# Altium footprint library 3.22-杂项.PcbLib: 985 footprints (part 8 of 64)
Each footprint in its own frame and in the unit in brackets; x right, y up, seen from the top. Pads: shape width x height; smd on the part's side, far side on the other; paste and mask are expansions set on the pad; w line width, h text height; cw(c..) or ccw(c..) is an arc to the next point about the centre after c.
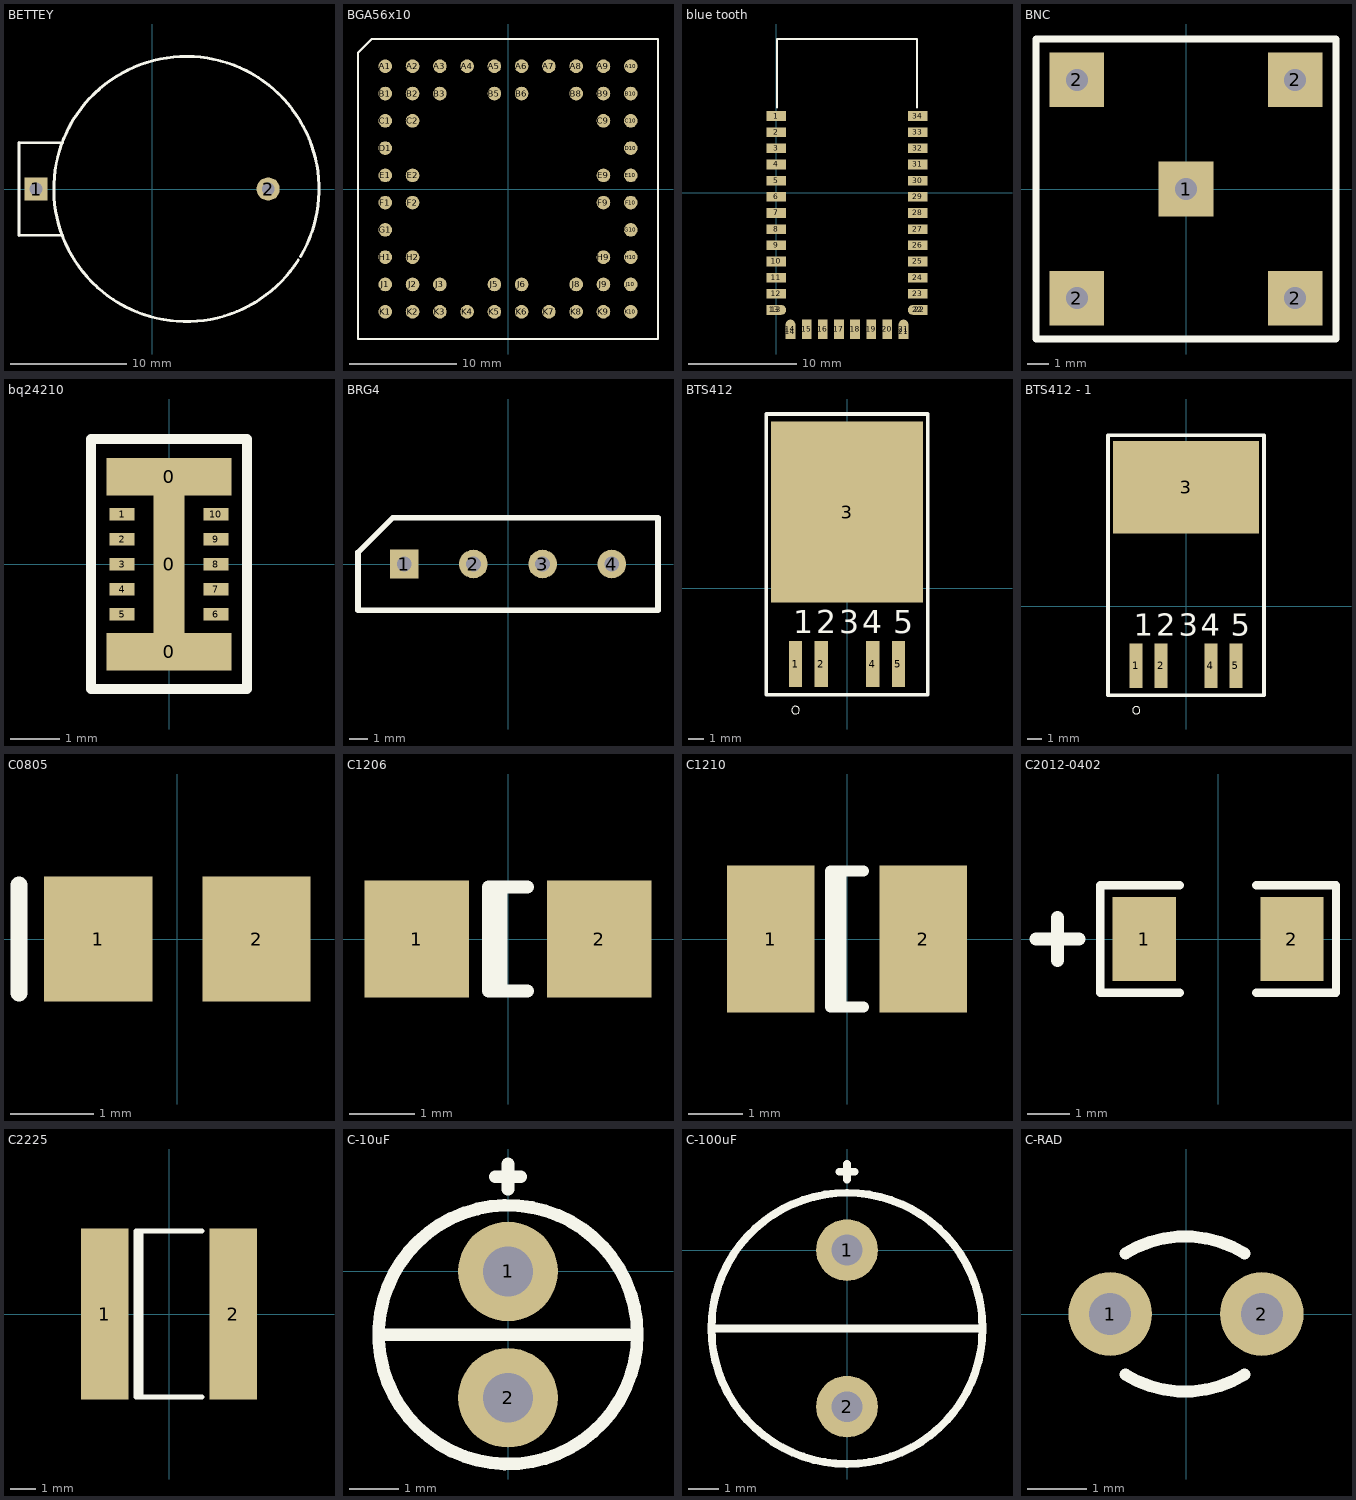
[diagram p7: the footprints below, top view; thin cyan lines are the x and y axes]

## BETTEY [mm] "3V钮扣电池，2脚"
pads (2):
  rect 2x2 hole 1.1: 1(-10,0)
  round 2 hole 1.1: 2(10,0)
Top Overlay:
  lines w0.2: -11.476,-4 -7.714,-4 ; -11.476,4 -7.714,4
  lines w0.254: -11.476,-4 -11.476,4 ; 12.597,-6.136 cw(c2.954,0) 12.787,-5.827

## BGA56x10 [mil]
pads (56):
  round 50 smd: A1(-450,450) A2(-350,450) A3(-250,450) A4(-150,450) A5(-50,450) A6(50,450) A7(150,450) A8(250,450) A9(350,450) A10(450,450) B1(-450,350) B2(-350,350) B3(-250,350) B5(-50,350) B6(50,350) B8(250,350) B9(350,350) B10(450,350) C1(-450,250) C2(-350,250) C9(350,250) C10(450,250) D1(-450,150) D10(450,150) E1(-450,50) E2(-350,50) E9(350,50) E10(450,50) F1(-450,-50) F2(-350,-50) F9(350,-50) F10(450,-50) G1(-450,-150) G10(450,-150) H1(-450,-250) H2(-350,-250) H9(350,-250) H10(450,-250) J1(-450,-350) J2(-350,-350) J3(-250,-350) J5(-50,-350) J6(50,-350) J8(250,-350) J9(350,-350) J10(450,-350) K1(-450,-450) K2(-350,-450) K3(-250,-450) K4(-150,-450) K5(-50,-450) K6(50,-450) K7(150,-450) K8(250,-450) K9(350,-450) K10(450,-450)
Top Overlay:
  lines w8: -550,-550 -550,500 -500,550 550,550 550,-550 -550,-550

## blue tooth [mm] "欢迎光临https://shop463601444.taobao.com 掌柜ID：黄晶宝石"
pads (38):
  rect 1.8x0.9 smd: 1(0,7.112) 2(0,5.612) 3(0,4.112) 4(0,2.612) 5(0,1.112) 6(0,-0.388) 7(0,-1.888) 8(0,-3.388) 9(0,-4.888) 10(0,-6.388) 11(0,-7.888) 12(0,-9.388) 23(13.1,-9.388) 24(13.1,-7.888) 25(13.1,-6.388) 26(13.1,-4.888) 27(13.1,-3.388) 28(13.1,-1.888) 29(13.1,-0.388) 30(13.1,1.112) 31(13.1,2.612) 32(13.1,4.112) 33(13.1,5.612) 34(13.1,7.112)
  rect 1.35x0.9 smd: 13(-0.225,-10.888) 22(13.325,-10.888)
  oval 1.8x0.9 smd: 13(0,-10.888) 22(13.1,-10.888)
  rect 0.9x1.35 smd: 14(1.3,-12.913) 21(11.8,-12.913)
  oval 0.9x1.8 smd: 14(1.3,-12.688) 21(11.8,-12.688)
  rect 0.9x1.8 smd: 15(2.8,-12.688) 16(4.3,-12.688) 17(5.8,-12.688) 18(7.3,-12.688) 19(8.8,-12.688) 20(10.3,-12.688)
Top Overlay:
  lines w0.152: 0.05,7.874 0.05,14.262 13.05,14.262 13.05,7.874

## BNC [mil]
pads (5):
  rect 100x100 hole 40: 1(0,0) 2(-200,-200) 2(-200,200) 2(200,-200) 2(200,200)
Top Overlay:
  lines w12: -275,-275 -275,275 275,275 275,-275 -275,-275

## bq24210 [mil]
pads (13):
  rect 100x30 smd mask+1: 0(0,-70) 0(0,70)
  rect 25x110 smd mask+1: 0(0,0)
  rect 20x10 smd mask+0.5: 1(-37.5,40) 2(-37.5,20) 3(-37.5,0) 4(-37.5,-20) 5(-37.5,-40) 6(37.5,-40) 7(37.5,-20) 8(37.5,0) 9(37.5,20) 10(37.5,40)
Top Overlay:
  lines w8: -62.5,-100 62.5,-100 62.5,100 -62.5,100 -62.5,-100

## BRG4 [mil] "AC整流桥4，KBP310"
pads (4):
  rect 62x62 hole 32: 1(-225,0)
  round 62 hole 32: 2(-75,0) 3(75,0) 4(225,0)
Top Overlay:
  lines w12: -325,-100 -325,25 -250,100 325,100 325,-100 -325,-100

## BTS412 [mil]
pads (5):
  rect 35x120 smd: 1(-133.86,-197.5) 2(-66.93,-197.5) 4(66.93,-197.5) 5(133.86,-197.5)
  rect 394x470 smd: 3(0,197.5)
Top Overlay:
  circle w1: c-133.86,-317.5 r10
  lines w9.84: -210,-277.5 -210,452.5 210,452.5 210,-277.5 -210,-277.5
  text "1" at -140,-117.5 h60
  text "2" at -80,-117.5 h60
  text "3" at -20,-117.5 h60
  text "4" at 40,-117.5 h60
  text "5" at 120,-117.5 h60

## BTS412 - 1 [mil]
pads (5):
  rect 35x120 smd: 1(-133.86,-160) 2(-66.93,-160) 4(66.93,-160) 5(133.86,-160)
  rect 394x250 smd: 3(0,320)
Top Overlay:
  circle w1: c-133.86,-280 r10
  lines w9.84: -210,-240 210,-240 210,460 -210,460 -210,-240
  text "5" at 120,-80 h60
  text "4" at 40,-80 h60
  text "3" at -20,-80 h60
  text "2" at -80,-80 h60
  text "1" at -140,-80 h60

## C0805 [mm] "Chip Capacitor; Body 2.0 x 1.2 mm (LxW typ)"
height 1.1
pads (2):
  rect 1.3x1.5 smd: 1(-0.95,0) 2(0.95,0)
Top Overlay:
  lines w0.2: -1.9,-0.65 -1.9,0.65

## C1206 [mm] "Chip Capacitor; Body 3.2 x 1.6 mm (LxW typ)"
height 1.35
pads (2):
  rect 1.6x1.8 smd: 1(-1.4,0) 2(1.4,0)
Top Overlay:
  lines w0.2: -0.11,-0.8 -0.11,0.8 ; 0.3,-0.8 -0.3,-0.8 -0.3,0.8 0.3,0.8

## C1210 [mm] "Chip Capacitor; Body 3.2 x 2.5 mm (LxW typ)"
height 1.35
pads (2):
  rect 1.6x2.7 smd: 1(-1.4,0) 2(1.4,0)
Top Overlay:
  lines w0.2: -0.11,-1.25 -0.11,1.25 ; 0.3,-1.25 -0.3,-1.25 -0.3,1.25 0.3,1.25

## C2012-0402 [mm] "1206Cap,Led,Diode,C2012-0402"
pads (2):
  rect 1.5x2 smd: 1(-1.75,0) 2(1.75,0)
Top Overlay:
  lines w0.2: -0.908,-1.27 -2.794,-1.27 -2.794,1.27 -0.908,1.27 ; 0.908,-1.27 2.794,-1.27 2.794,1.27 0.908,1.27
  lines w0.305: -4.318,0 -3.302,0 ; -3.81,-0.508 -3.81,0.508

## C2225 [mm] "Chip Capacitor; Body 5.6 x 6.4 mm (LxW typ)"
height 1.1
pads (2):
  rect 1.9x6.8 smd: 1(-2.55,0) 2(2.55,0)
Top Overlay:
  lines w0.2: -1.11,-3.3 -1.11,3.3 ; 1.3,-3.3 -1.3,-3.3 -1.3,3.3 1.3,3.3

## C-10uF [mm]
pads (2):
  round 2 hole 1: 1(0,0) 2(0,-2.54)
Top Overlay:
  circle w0.254: c0,-1.27 r2.6
  lines w0.254: -2.54,-1.27 2.6,-1.27 ; -0.254,1.905 0.254,1.905 ; 0,1.651 0,2.159

## C-100uF [mm]
pads (2):
  round 2 hole 1: 1(0,0) 2(0,-5.08)
Top Overlay:
  circle w0.254: c0,-2.54 r4.4
  lines w0.254: -4.318,-2.54 4.4,-2.54 ; -0.254,2.54 0.254,2.54 ; 0,2.286 0,2.794

## C-RAD [mm] "瓷片电容"
height 6
pads (2):
  round 1.4 hole 0.7: 1(-1.27,0) 2(1.27,0)
Top Overlay:
  lines w0.2: -1.016,-1.016 ccw(c-0.018,0.606) 0.981,-1.016 ; -1.016,1.016 cw(c-0.018,-0.606) 0.981,1.016